# Altium schematic symbol library CMOS.SchLib: 1073 symbols (part 1 of 4) (continued)
## IRF120 (continued)
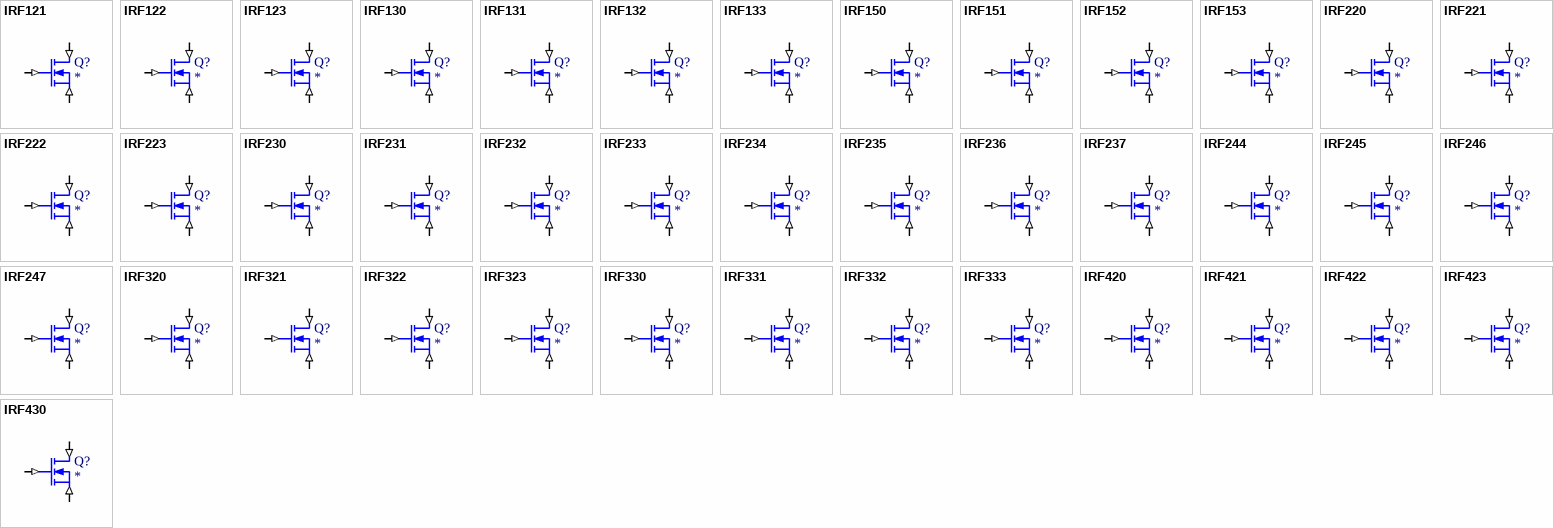
[diagram p4: symbols IRF121 to IRF430]

## IRF121
designator Q?
N-Channel MOSFET
simulation model IRF121 (SUBCKT)
pins: 1 D (in), 2 G (in), 3 S (in)
1 alternate drawing of the same symbol

## IRF122
designator Q?
N-Channel MOSFET
simulation model IRF122 (SUBCKT)
pins: 1 D (in), 2 G (in), 3 S (in)
1 alternate drawing of the same symbol

## IRF123
designator Q?
N-Channel MOSFET
simulation model IRF123 (SUBCKT)
pins: 1 D (in), 2 G (in), 3 S (in)
1 alternate drawing of the same symbol

## IRF130
designator Q?
N-Channel MOSFET
simulation model IRF130 (SUBCKT)
pins: 1 D (in), 2 G (in), 3 S (in)
1 alternate drawing of the same symbol

## IRF131
designator Q?
N-Channel MOSFET
simulation model IRF131 (SUBCKT)
pins: 1 D (in), 2 G (in), 3 S (in)
1 alternate drawing of the same symbol

## IRF132
designator Q?
N-Channel MOSFET
simulation model IRF132 (SUBCKT)
pins: 1 D (in), 2 G (in), 3 S (in)
1 alternate drawing of the same symbol

## IRF133
designator Q?
N-Channel MOSFET
simulation model IRF133 (SUBCKT)
pins: 1 D (in), 2 G (in), 3 S (in)
1 alternate drawing of the same symbol

## IRF150
designator Q?
N-Channel MOSFET
simulation model IRF150 (SUBCKT)
pins: 1 D (in), 2 G (in), 3 S (in)
1 alternate drawing of the same symbol

## IRF151
designator Q?
N-Channel MOSFET
simulation model IRF151 (SUBCKT)
pins: 1 D (in), 2 G (in), 3 S (in)
1 alternate drawing of the same symbol

## IRF152
designator Q?
N-Channel MOSFET
simulation model IRF152 (SUBCKT)
pins: 1 D (in), 2 G (in), 3 S (in)
1 alternate drawing of the same symbol

## IRF153
designator Q?
N-Channel MOSFET
simulation model IRF153 (SUBCKT)
pins: 1 D (in), 2 G (in), 3 S (in)
1 alternate drawing of the same symbol

## IRF220
designator Q?
N-Channel MOSFET
simulation model IRF220 (SUBCKT)
pins: 1 D (in), 2 G (in), 3 S (in)
1 alternate drawing of the same symbol

## IRF221
designator Q?
N-Channel MOSFET
simulation model IRF221 (SUBCKT)
pins: 1 D (in), 2 G (in), 3 S (in)
1 alternate drawing of the same symbol

## IRF222
designator Q?
N-Channel MOSFET
simulation model IRF222 (SUBCKT)
pins: 1 D (in), 2 G (in), 3 S (in)
1 alternate drawing of the same symbol

## IRF223
designator Q?
N-Channel MOSFET
simulation model IRF223 (SUBCKT)
pins: 1 D (in), 2 G (in), 3 S (in)
1 alternate drawing of the same symbol

## IRF230
designator Q?
N-Channel MOSFET
simulation model IRF230 (SUBCKT)
pins: 1 D (in), 2 G (in), 3 S (in)
1 alternate drawing of the same symbol

## IRF231
designator Q?
N-Channel MOSFET
simulation model IRF231 (SUBCKT)
pins: 1 D (in), 2 G (in), 3 S (in)
1 alternate drawing of the same symbol

## IRF232
designator Q?
N-Channel MOSFET
simulation model IRF232 (SUBCKT)
pins: 1 D (in), 2 G (in), 3 S (in)
1 alternate drawing of the same symbol

## IRF233
designator Q?
N-Channel MOSFET
simulation model IRF233 (SUBCKT)
pins: 1 D (in), 2 G (in), 3 S (in)
1 alternate drawing of the same symbol

## IRF234
designator Q?
N-Channel MOSFET
simulation model IRF234 (SUBCKT)
pins: 1 D (in), 2 G (in), 3 S (in)
1 alternate drawing of the same symbol

## IRF235
designator Q?
N-Channel MOSFET
simulation model IRF235 (SUBCKT)
pins: 1 D (in), 2 G (in), 3 S (in)
1 alternate drawing of the same symbol

## IRF236
designator Q?
N-Channel MOSFET
simulation model IRF236 (SUBCKT)
pins: 1 D (in), 2 G (in), 3 S (in)
1 alternate drawing of the same symbol

## IRF237
designator Q?
N-Channel MOSFET
simulation model IRF237 (SUBCKT)
pins: 1 D (in), 2 G (in), 3 S (in)
1 alternate drawing of the same symbol

## IRF244
designator Q?
N-Channel MOSFET
simulation model IRF244 (SUBCKT)
pins: 1 D (in), 2 G (in), 3 S (in)
1 alternate drawing of the same symbol

## IRF245
designator Q?
N-Channel MOSFET
simulation model IRF245 (SUBCKT)
pins: 1 D (in), 2 G (in), 3 S (in)
1 alternate drawing of the same symbol

## IRF246
designator Q?
N-Channel MOSFET
simulation model IRF246 (SUBCKT)
pins: 1 D (in), 2 G (in), 3 S (in)
1 alternate drawing of the same symbol

## IRF247
designator Q?
N-Channel MOSFET
simulation model IRF247 (SUBCKT)
pins: 1 D (in), 2 G (in), 3 S (in)
1 alternate drawing of the same symbol

## IRF320
designator Q?
N-Channel MOSFET
simulation model IRF320 (SUBCKT)
pins: 1 D (in), 2 G (in), 3 S (in)
1 alternate drawing of the same symbol

## IRF321
designator Q?
N-Channel MOSFET
simulation model IRF321 (SUBCKT)
pins: 1 D (in), 2 G (in), 3 S (in)
1 alternate drawing of the same symbol

## IRF322
designator Q?
N-Channel MOSFET
simulation model IRF322 (SUBCKT)
pins: 1 D (in), 2 G (in), 3 S (in)
1 alternate drawing of the same symbol

## IRF323
designator Q?
N-Channel MOSFET
simulation model IRF323 (SUBCKT)
pins: 1 D (in), 2 G (in), 3 S (in)
1 alternate drawing of the same symbol

## IRF330
designator Q?
N-Channel MOSFET
simulation model IRF330 (SUBCKT)
pins: 1 D (in), 2 G (in), 3 S (in)
1 alternate drawing of the same symbol

## IRF331
designator Q?
N-Channel MOSFET
simulation model IRF331 (SUBCKT)
pins: 1 D (in), 2 G (in), 3 S (in)
1 alternate drawing of the same symbol

## IRF332
designator Q?
N-Channel MOSFET
simulation model IRF332 (SUBCKT)
pins: 1 D (in), 2 G (in), 3 S (in)
1 alternate drawing of the same symbol

## IRF333
designator Q?
N-Channel MOSFET
simulation model IRF333 (SUBCKT)
pins: 1 D (in), 2 G (in), 3 S (in)
1 alternate drawing of the same symbol

## IRF420
designator Q?
N-Channel MOSFET
simulation model IRF420 (SUBCKT)
pins: 1 D (in), 2 G (in), 3 S (in)
1 alternate drawing of the same symbol

## IRF421
designator Q?
N-Channel MOSFET
simulation model IRF421 (SUBCKT)
pins: 1 D (in), 2 G (in), 3 S (in)
1 alternate drawing of the same symbol

## IRF422
designator Q?
N-Channel MOSFET
simulation model IRF422 (SUBCKT)
pins: 1 D (in), 2 G (in), 3 S (in)
1 alternate drawing of the same symbol

## IRF423
designator Q?
N-Channel MOSFET
simulation model IRF423 (SUBCKT)
pins: 1 D (in), 2 G (in), 3 S (in)
1 alternate drawing of the same symbol

## IRF430
designator Q?
N-Channel MOSFET
simulation model IRF430 (SUBCKT)
pins: 1 D (in), 2 G (in), 3 S (in)
1 alternate drawing of the same symbol

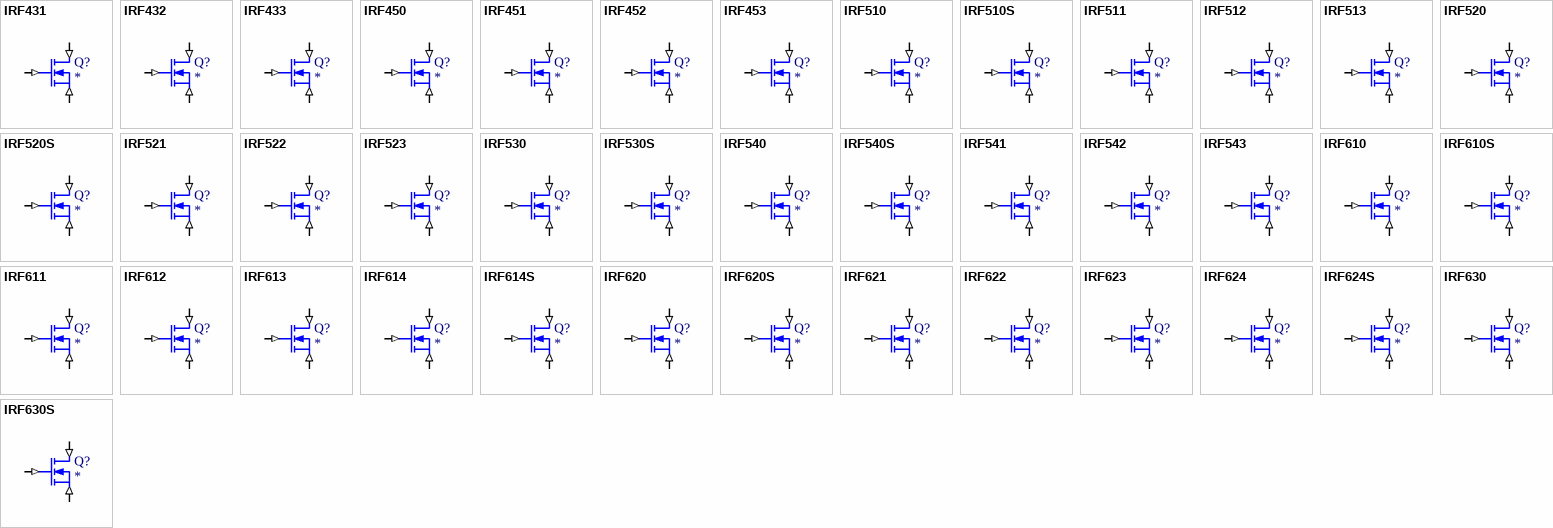
[diagram p5: symbols IRF431 to IRF630S]

## IRF431
designator Q?
N-Channel MOSFET
simulation model IRF431 (SUBCKT)
pins: 1 D (in), 2 G (in), 3 S (in)
1 alternate drawing of the same symbol

## IRF432
designator Q?
N-Channel MOSFET
simulation model IRF432 (SUBCKT)
pins: 1 D (in), 2 G (in), 3 S (in)
1 alternate drawing of the same symbol

## IRF433
designator Q?
N-Channel MOSFET
simulation model IRF433 (SUBCKT)
pins: 1 D (in), 2 G (in), 3 S (in)
1 alternate drawing of the same symbol

## IRF450
designator Q?
N-Channel MOSFET
simulation model IRF450 (SUBCKT)
pins: 1 D (in), 2 G (in), 3 S (in)
1 alternate drawing of the same symbol

## IRF451
designator Q?
N-Channel MOSFET
simulation model IRF451 (SUBCKT)
pins: 1 D (in), 2 G (in), 3 S (in)
1 alternate drawing of the same symbol

## IRF452
designator Q?
N-Channel MOSFET
simulation model IRF452 (SUBCKT)
pins: 1 D (in), 2 G (in), 3 S (in)
1 alternate drawing of the same symbol

## IRF453
designator Q?
N-Channel MOSFET
simulation model IRF453 (SUBCKT)
pins: 1 D (in), 2 G (in), 3 S (in)
1 alternate drawing of the same symbol

## IRF510
designator Q?
N-Channel MOSFET
simulation model IRF510 (SUBCKT)
pins: 1 D (in), 2 G (in), 3 S (in)
1 alternate drawing of the same symbol

## IRF510S
designator Q?
N-Channel MOSFET
simulation model IRF510S (SUBCKT)
pins: 1 D (in), 2 G (in), 3 S (in)
1 alternate drawing of the same symbol

## IRF511
designator Q?
N-Channel MOSFET
simulation model IRF511 (SUBCKT)
pins: 1 D (in), 2 G (in), 3 S (in)
1 alternate drawing of the same symbol

## IRF512
designator Q?
N-Channel MOSFET
simulation model IRF512 (SUBCKT)
pins: 1 D (in), 2 G (in), 3 S (in)
1 alternate drawing of the same symbol

## IRF513
designator Q?
N-Channel MOSFET
simulation model IRF513 (SUBCKT)
pins: 1 D (in), 2 G (in), 3 S (in)
1 alternate drawing of the same symbol

## IRF520
designator Q?
N-Channel MOSFET
simulation model IRF520 (SUBCKT)
pins: 1 D (in), 2 G (in), 3 S (in)
1 alternate drawing of the same symbol

## IRF520S
designator Q?
N-Channel MOSFET
simulation model IRF520S (SUBCKT)
pins: 1 D (in), 2 G (in), 3 S (in)
1 alternate drawing of the same symbol

## IRF521
designator Q?
N-Channel MOSFET
simulation model IRF521 (SUBCKT)
pins: 1 D (in), 2 G (in), 3 S (in)
1 alternate drawing of the same symbol

## IRF522
designator Q?
N-Channel MOSFET
simulation model IRF522 (SUBCKT)
pins: 1 D (in), 2 G (in), 3 S (in)
1 alternate drawing of the same symbol

## IRF523
designator Q?
N-Channel MOSFET
simulation model IRF523 (SUBCKT)
pins: 1 D (in), 2 G (in), 3 S (in)
1 alternate drawing of the same symbol

## IRF530
designator Q?
N-Channel MOSFET
simulation model IRF530 (SUBCKT)
pins: 1 D (in), 2 G (in), 3 S (in)
1 alternate drawing of the same symbol

## IRF530S
designator Q?
N-Channel MOSFET
simulation model IRF530S (SUBCKT)
pins: 1 D (in), 2 G (in), 3 S (in)
1 alternate drawing of the same symbol

## IRF540
designator Q?
N-Channel MOSFET
simulation model IRF540 (SUBCKT)
pins: 1 D (in), 2 G (in), 3 S (in)
1 alternate drawing of the same symbol

## IRF540S
designator Q?
N-Channel MOSFET
simulation model IRF540S (SUBCKT)
pins: 1 D (in), 2 G (in), 3 S (in)
1 alternate drawing of the same symbol

## IRF541
designator Q?
N-Channel MOSFET
simulation model IRF541 (SUBCKT)
pins: 1 D (in), 2 G (in), 3 S (in)
1 alternate drawing of the same symbol

## IRF542
designator Q?
N-Channel MOSFET
simulation model IRF542 (SUBCKT)
pins: 1 D (in), 2 G (in), 3 S (in)
1 alternate drawing of the same symbol

## IRF543
designator Q?
N-Channel MOSFET
simulation model IRF543 (SUBCKT)
pins: 1 D (in), 2 G (in), 3 S (in)
1 alternate drawing of the same symbol

## IRF610
designator Q?
N-Channel MOSFET
simulation model IRF610 (SUBCKT)
pins: 1 D (in), 2 G (in), 3 S (in)
1 alternate drawing of the same symbol

## IRF610S
designator Q?
N-Channel MOSFET
simulation model IRF610S (SUBCKT)
pins: 1 D (in), 2 G (in), 3 S (in)
1 alternate drawing of the same symbol

## IRF611
designator Q?
N-Channel MOSFET
simulation model IRF611 (SUBCKT)
pins: 1 D (in), 2 G (in), 3 S (in)
1 alternate drawing of the same symbol

## IRF612
designator Q?
N-Channel MOSFET
simulation model IRF612 (SUBCKT)
pins: 1 D (in), 2 G (in), 3 S (in)
1 alternate drawing of the same symbol

## IRF613
designator Q?
N-Channel MOSFET
simulation model IRF613 (SUBCKT)
pins: 1 D (in), 2 G (in), 3 S (in)
1 alternate drawing of the same symbol

## IRF614
designator Q?
N-Channel MOSFET
simulation model IRF614 (SUBCKT)
pins: 1 D (in), 2 G (in), 3 S (in)
1 alternate drawing of the same symbol

## IRF614S
designator Q?
N-Channel MOSFET
simulation model IRF614S (SUBCKT)
pins: 1 D (in), 2 G (in), 3 S (in)
1 alternate drawing of the same symbol

## IRF620
designator Q?
N-Channel MOSFET
simulation model IRF620 (SUBCKT)
pins: 1 D (in), 2 G (in), 3 S (in)
1 alternate drawing of the same symbol

## IRF620S
designator Q?
N-Channel MOSFET
simulation model IRF620S (SUBCKT)
pins: 1 D (in), 2 G (in), 3 S (in)
1 alternate drawing of the same symbol

## IRF621
designator Q?
N-Channel MOSFET
simulation model IRF621 (SUBCKT)
pins: 1 D (in), 2 G (in), 3 S (in)
1 alternate drawing of the same symbol

## IRF622
designator Q?
N-Channel MOSFET
simulation model IRF622 (SUBCKT)
pins: 1 D (in), 2 G (in), 3 S (in)
1 alternate drawing of the same symbol

## IRF623
designator Q?
N-Channel MOSFET
simulation model IRF623 (SUBCKT)
pins: 1 D (in), 2 G (in), 3 S (in)
1 alternate drawing of the same symbol

## IRF624
designator Q?
N-Channel MOSFET
simulation model IRF624 (SUBCKT)
pins: 1 D (in), 2 G (in), 3 S (in)
1 alternate drawing of the same symbol

## IRF624S
designator Q?
N-Channel MOSFET
simulation model IRF624S (SUBCKT)
pins: 1 D (in), 2 G (in), 3 S (in)
1 alternate drawing of the same symbol

## IRF630
designator Q?
N-Channel MOSFET
simulation model IRF630 (SUBCKT)
pins: 1 D (in), 2 G (in), 3 S (in)
1 alternate drawing of the same symbol

## IRF630S
designator Q?
N-Channel MOSFET
simulation model IRF630S (SUBCKT)
pins: 1 D (in), 2 G (in), 3 S (in)
1 alternate drawing of the same symbol

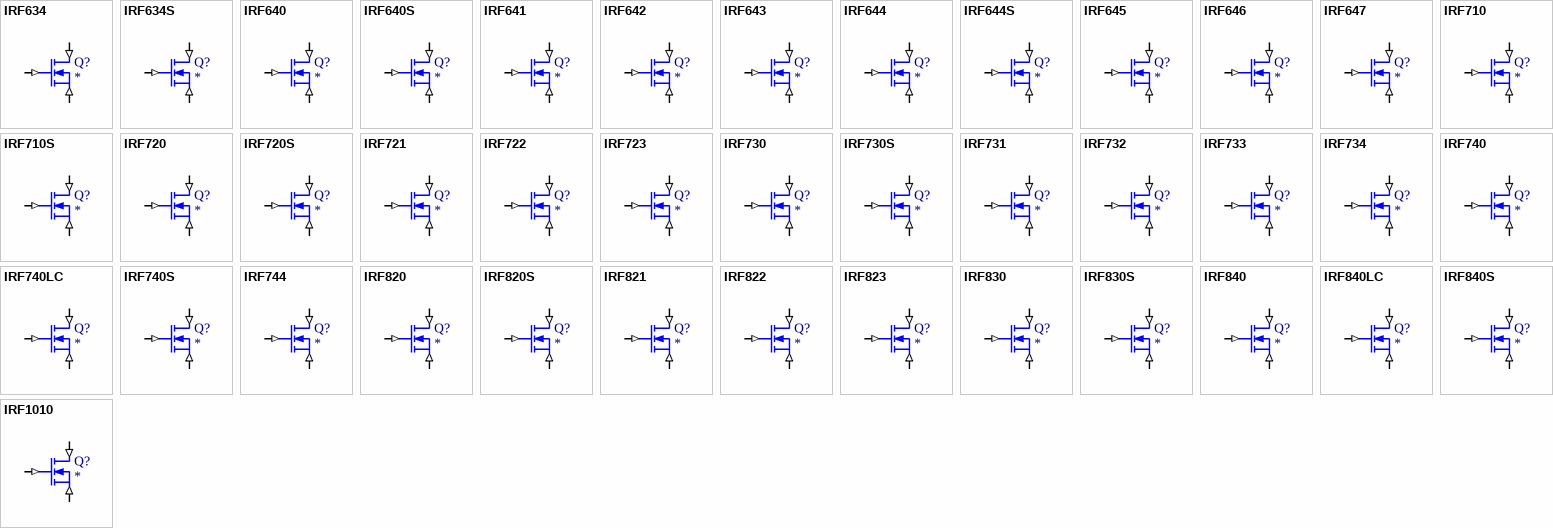
[diagram p6: symbols IRF634 to IRF1010]

## IRF634
designator Q?
N-Channel MOSFET
simulation model IRF634 (SUBCKT)
pins: 1 D (in), 2 G (in), 3 S (in)
1 alternate drawing of the same symbol

## IRF634S
designator Q?
N-Channel MOSFET
simulation model IRF634S (SUBCKT)
pins: 1 D (in), 2 G (in), 3 S (in)
1 alternate drawing of the same symbol

## IRF640
designator Q?
N-Channel MOSFET
simulation model IRF640 (SUBCKT)
pins: 1 D (in), 2 G (in), 3 S (in)
1 alternate drawing of the same symbol

## IRF640S
designator Q?
N-Channel MOSFET
simulation model IRF640S (SUBCKT)
pins: 1 D (in), 2 G (in), 3 S (in)
1 alternate drawing of the same symbol

## IRF641
designator Q?
N-Channel MOSFET
simulation model IRF641 (SUBCKT)
pins: 1 D (in), 2 G (in), 3 S (in)
1 alternate drawing of the same symbol

## IRF642
designator Q?
N-Channel MOSFET
simulation model IRF642 (SUBCKT)
pins: 1 D (in), 2 G (in), 3 S (in)
1 alternate drawing of the same symbol

## IRF643
designator Q?
N-Channel MOSFET
simulation model IRF643 (SUBCKT)
pins: 1 D (in), 2 G (in), 3 S (in)
1 alternate drawing of the same symbol

## IRF644
designator Q?
N-Channel MOSFET
simulation model IRF644 (SUBCKT)
pins: 1 D (in), 2 G (in), 3 S (in)
1 alternate drawing of the same symbol

## IRF644S
designator Q?
N-Channel MOSFET
simulation model IRF644S (SUBCKT)
pins: 1 D (in), 2 G (in), 3 S (in)
1 alternate drawing of the same symbol

## IRF645
designator Q?
N-Channel MOSFET
simulation model IRF645 (SUBCKT)
pins: 1 D (in), 2 G (in), 3 S (in)
1 alternate drawing of the same symbol

## IRF646
designator Q?
N-Channel MOSFET
simulation model IRF646 (SUBCKT)
pins: 1 D (in), 2 G (in), 3 S (in)
1 alternate drawing of the same symbol

## IRF647
designator Q?
N-Channel MOSFET
simulation model IRF647 (SUBCKT)
pins: 1 D (in), 2 G (in), 3 S (in)
1 alternate drawing of the same symbol

## IRF710
designator Q?
N-Channel MOSFET
simulation model IRF710 (SUBCKT)
pins: 1 D (in), 2 G (in), 3 S (in)
1 alternate drawing of the same symbol

## IRF710S
designator Q?
N-Channel MOSFET
simulation model IRF710S (SUBCKT)
pins: 1 D (in), 2 G (in), 3 S (in)
1 alternate drawing of the same symbol

## IRF720
designator Q?
N-Channel MOSFET
simulation model IRF720 (SUBCKT)
pins: 1 D (in), 2 G (in), 3 S (in)
1 alternate drawing of the same symbol

## IRF720S
designator Q?
N-Channel MOSFET
simulation model IRF720S (SUBCKT)
pins: 1 D (in), 2 G (in), 3 S (in)
1 alternate drawing of the same symbol

## IRF721
designator Q?
N-Channel MOSFET
simulation model IRF721 (SUBCKT)
pins: 1 D (in), 2 G (in), 3 S (in)
1 alternate drawing of the same symbol

## IRF722
designator Q?
N-Channel MOSFET
simulation model IRF722 (SUBCKT)
pins: 1 D (in), 2 G (in), 3 S (in)
1 alternate drawing of the same symbol

## IRF723
designator Q?
N-Channel MOSFET
simulation model IRF723 (SUBCKT)
pins: 1 D (in), 2 G (in), 3 S (in)
1 alternate drawing of the same symbol

## IRF730
designator Q?
N-Channel MOSFET
simulation model IRF730 (SUBCKT)
pins: 1 D (in), 2 G (in), 3 S (in)
1 alternate drawing of the same symbol

## IRF730S
designator Q?
N-Channel MOSFET
simulation model IRF730S (SUBCKT)
pins: 1 D (in), 2 G (in), 3 S (in)
1 alternate drawing of the same symbol

## IRF731
designator Q?
N-Channel MOSFET
simulation model IRF731 (SUBCKT)
pins: 1 D (in), 2 G (in), 3 S (in)
1 alternate drawing of the same symbol

## IRF732
designator Q?
N-Channel MOSFET
simulation model IRF732 (SUBCKT)
pins: 1 D (in), 2 G (in), 3 S (in)
1 alternate drawing of the same symbol

## IRF733
designator Q?
N-Channel MOSFET
simulation model IRF733 (SUBCKT)
pins: 1 D (in), 2 G (in), 3 S (in)
1 alternate drawing of the same symbol

## IRF734
designator Q?
N-Channel MOSFET
simulation model IRF734 (SUBCKT)
pins: 1 D (in), 2 G (in), 3 S (in)
1 alternate drawing of the same symbol

## IRF740
designator Q?
N-Channel MOSFET
simulation model IRF740 (SUBCKT)
pins: 1 D (in), 2 G (in), 3 S (in)
1 alternate drawing of the same symbol

## IRF740LC
designator Q?
N-Channel MOSFET
simulation model IRF740LC (SUBCKT)
pins: 1 D (in), 2 G (in), 3 S (in)
1 alternate drawing of the same symbol

## IRF740S
designator Q?
N-Channel MOSFET
simulation model IRF740S (SUBCKT)
pins: 1 D (in), 2 G (in), 3 S (in)
1 alternate drawing of the same symbol

## IRF744
designator Q?
N-Channel MOSFET
simulation model IRF744 (SUBCKT)
pins: 1 D (in), 2 G (in), 3 S (in)
1 alternate drawing of the same symbol

## IRF820
designator Q?
N-Channel MOSFET
simulation model IRF820 (SUBCKT)
pins: 1 D (in), 2 G (in), 3 S (in)
1 alternate drawing of the same symbol

## IRF820S
designator Q?
N-Channel MOSFET
simulation model IRF820S (SUBCKT)
pins: 1 D (in), 2 G (in), 3 S (in)
1 alternate drawing of the same symbol

## IRF821
designator Q?
N-Channel MOSFET
simulation model IRF821 (SUBCKT)
pins: 1 D (in), 2 G (in), 3 S (in)
1 alternate drawing of the same symbol

## IRF822
designator Q?
N-Channel MOSFET
simulation model IRF822 (SUBCKT)
pins: 1 D (in), 2 G (in), 3 S (in)
1 alternate drawing of the same symbol

## IRF823
designator Q?
N-Channel MOSFET
simulation model IRF823 (SUBCKT)
pins: 1 D (in), 2 G (in), 3 S (in)
1 alternate drawing of the same symbol

## IRF830
designator Q?
N-Channel MOSFET
simulation model IRF830 (SUBCKT)
pins: 1 D (in), 2 G (in), 3 S (in)
1 alternate drawing of the same symbol

## IRF830S
designator Q?
N-Channel MOSFET
simulation model IRF830S (SUBCKT)
pins: 1 D (in), 2 G (in), 3 S (in)
1 alternate drawing of the same symbol

## IRF840
designator Q?
N-Channel MOSFET
simulation model IRF840 (SUBCKT)
pins: 1 D (in), 2 G (in), 3 S (in)
1 alternate drawing of the same symbol

## IRF840LC
designator Q?
N-Channel MOSFET
simulation model IRF840LC (SUBCKT)
pins: 1 D (in), 2 G (in), 3 S (in)
1 alternate drawing of the same symbol

## IRF840S
designator Q?
N-Channel MOSFET
simulation model IRF840S (SUBCKT)
pins: 1 D (in), 2 G (in), 3 S (in)
1 alternate drawing of the same symbol

## IRF1010
designator Q?
N-Channel MOSFET
simulation model IRF1010 (SUBCKT)
pins: 1 D (in), 2 G (in), 3 S (in)
1 alternate drawing of the same symbol

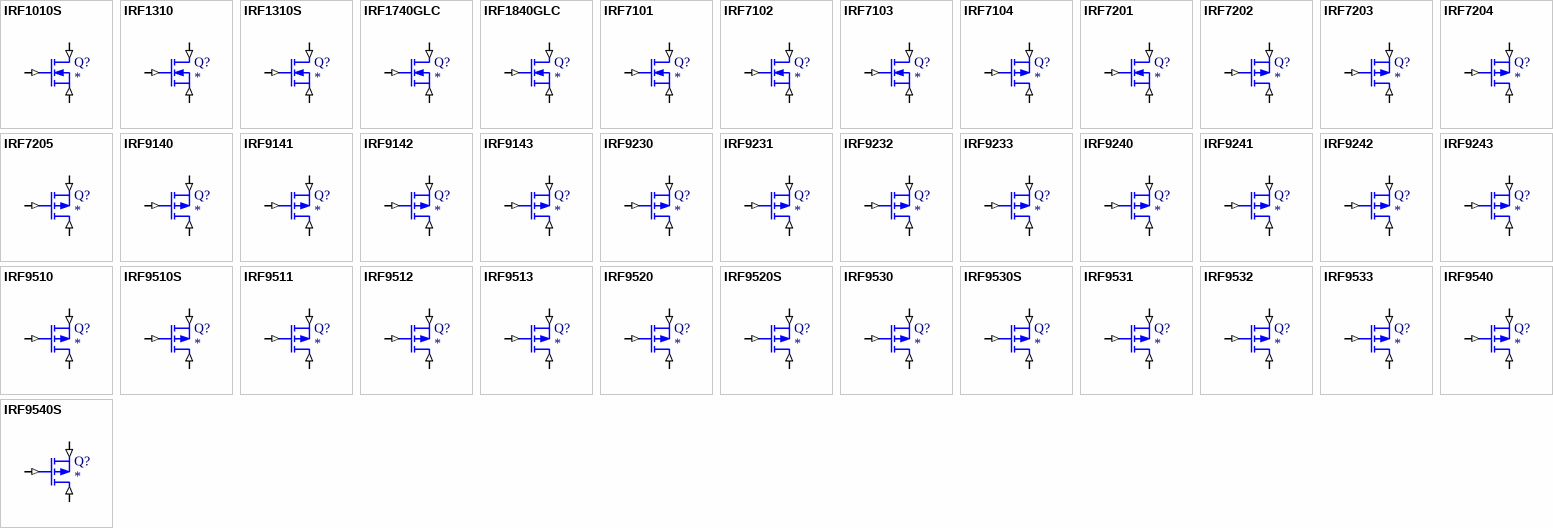
[diagram p7: symbols IRF1010S to IRF9540S]

## IRF1010S
designator Q?
N-Channel MOSFET
simulation model IRF1010S (SUBCKT)
pins: 1 D (in), 2 G (in), 3 S (in)
1 alternate drawing of the same symbol

## IRF1310
designator Q?
N-Channel MOSFET
simulation model IRF1310 (SUBCKT)
pins: 1 D (in), 2 G (in), 3 S (in)
1 alternate drawing of the same symbol

## IRF1310S
designator Q?
N-Channel MOSFET
simulation model IRF1310S (SUBCKT)
pins: 1 D (in), 2 G (in), 3 S (in)
1 alternate drawing of the same symbol

## IRF1740GLC
designator Q?
N-Channel MOSFET
simulation model IRF1740GLC (SUBCKT)
pins: 1 D (in), 2 G (in), 3 S (in)
1 alternate drawing of the same symbol

## IRF1840GLC
designator Q?
N-Channel MOSFET
simulation model IRF1840GLC (SUBCKT)
pins: 1 D (in), 2 G (in), 3 S (in)
1 alternate drawing of the same symbol

## IRF7101
designator Q?
N-Channel MOSFET
simulation model IRF7101 (SUBCKT)
pins: 1 D (in), 2 G (in), 3 S (in)
1 alternate drawing of the same symbol

## IRF7102
designator Q?
N-Channel MOSFET
simulation model IRF7102 (SUBCKT)
pins: 1 D (in), 2 G (in), 3 S (in)
1 alternate drawing of the same symbol

## IRF7103
designator Q?
N-Channel MOSFET
simulation model IRF7103 (SUBCKT)
pins: 1 D (in), 2 G (in), 3 S (in)
1 alternate drawing of the same symbol

## IRF7104
designator Q?
P-Channel MOSFET
simulation model IRF7104 (SUBCKT)
pins: 1 D (in), 2 G (in), 3 S (in)
1 alternate drawing of the same symbol

## IRF7201
designator Q?
N-Channel MOSFET
simulation model IRF7201 (SUBCKT)
pins: 1 D (in), 2 G (in), 3 S (in)
1 alternate drawing of the same symbol

## IRF7202
designator Q?
P-Channel MOSFET
simulation model IRF7202 (SUBCKT)
pins: 1 D (in), 2 G (in), 3 S (in)
1 alternate drawing of the same symbol

## IRF7203
designator Q?
P-Channel MOSFET
simulation model IRF7203 (SUBCKT)
pins: 1 D (in), 2 G (in), 3 S (in)
1 alternate drawing of the same symbol

## IRF7204
designator Q?
P-Channel MOSFET
simulation model IRF7204 (SUBCKT)
pins: 1 D (in), 2 G (in), 3 S (in)
1 alternate drawing of the same symbol

## IRF7205
designator Q?
P-Channel MOSFET
simulation model IRF7205 (SUBCKT)
pins: 1 D (in), 2 G (in), 3 S (in)
1 alternate drawing of the same symbol

## IRF9140
designator Q?
P-Channel MOSFET
simulation model IRF9140 (SUBCKT)
pins: 1 D (in), 2 G (in), 3 S (in)
1 alternate drawing of the same symbol

## IRF9141
designator Q?
P-Channel MOSFET
simulation model IRF9141 (SUBCKT)
pins: 1 D (in), 2 G (in), 3 S (in)
1 alternate drawing of the same symbol

## IRF9142
designator Q?
P-Channel MOSFET
simulation model IRF9142 (SUBCKT)
pins: 1 D (in), 2 G (in), 3 S (in)
1 alternate drawing of the same symbol

## IRF9143
designator Q?
P-Channel MOSFET
simulation model IRF9143 (SUBCKT)
pins: 1 D (in), 2 G (in), 3 S (in)
1 alternate drawing of the same symbol

## IRF9230
designator Q?
P-Channel MOSFET
simulation model IRF9230 (SUBCKT)
pins: 1 D (in), 2 G (in), 3 S (in)
1 alternate drawing of the same symbol

## IRF9231
designator Q?
P-Channel MOSFET
simulation model IRF9231 (SUBCKT)
pins: 1 D (in), 2 G (in), 3 S (in)
1 alternate drawing of the same symbol

## IRF9232
designator Q?
P-Channel MOSFET
simulation model IRF9232 (SUBCKT)
pins: 1 D (in), 2 G (in), 3 S (in)
1 alternate drawing of the same symbol

## IRF9233
designator Q?
P-Channel MOSFET
simulation model IRF9233 (SUBCKT)
pins: 1 D (in), 2 G (in), 3 S (in)
1 alternate drawing of the same symbol

## IRF9240
designator Q?
P-Channel MOSFET
simulation model IRF9240 (SUBCKT)
pins: 1 D (in), 2 G (in), 3 S (in)
1 alternate drawing of the same symbol

## IRF9241
designator Q?
P-Channel MOSFET
simulation model IRF9241 (SUBCKT)
pins: 1 D (in), 2 G (in), 3 S (in)
1 alternate drawing of the same symbol

## IRF9242
designator Q?
P-Channel MOSFET
simulation model IRF9242 (SUBCKT)
pins: 1 D (in), 2 G (in), 3 S (in)
1 alternate drawing of the same symbol

## IRF9243
designator Q?
P-Channel MOSFET
simulation model IRF9243 (SUBCKT)
pins: 1 D (in), 2 G (in), 3 S (in)
1 alternate drawing of the same symbol

## IRF9510
designator Q?
P-Channel MOSFET
simulation model IRF9510 (SUBCKT)
pins: 1 D (in), 2 G (in), 3 S (in)
1 alternate drawing of the same symbol

## IRF9510S
designator Q?
P-Channel MOSFET
simulation model IRF9510S (SUBCKT)
pins: 1 D (in), 2 G (in), 3 S (in)
1 alternate drawing of the same symbol

## IRF9511
designator Q?
P-Channel MOSFET
simulation model IRF9511 (SUBCKT)
pins: 1 D (in), 2 G (in), 3 S (in)
1 alternate drawing of the same symbol

## IRF9512
designator Q?
P-Channel MOSFET
simulation model IRF9512 (SUBCKT)
pins: 1 D (in), 2 G (in), 3 S (in)
1 alternate drawing of the same symbol

## IRF9513
designator Q?
P-Channel MOSFET
simulation model IRF9513 (SUBCKT)
pins: 1 D (in), 2 G (in), 3 S (in)
1 alternate drawing of the same symbol

## IRF9520
designator Q?
P-Channel MOSFET
simulation model IRF9520 (SUBCKT)
pins: 1 D (in), 2 G (in), 3 S (in)
1 alternate drawing of the same symbol

## IRF9520S
designator Q?
P-Channel MOSFET
simulation model IRF9520S (SUBCKT)
pins: 1 D (in), 2 G (in), 3 S (in)
1 alternate drawing of the same symbol

## IRF9530
designator Q?
P-Channel MOSFET
simulation model IRF9530 (SUBCKT)
pins: 1 D (in), 2 G (in), 3 S (in)
1 alternate drawing of the same symbol

## IRF9530S
designator Q?
P-Channel MOSFET
simulation model IRF9530S (SUBCKT)
pins: 1 D (in), 2 G (in), 3 S (in)
1 alternate drawing of the same symbol

## IRF9531
designator Q?
P-Channel MOSFET
simulation model IRF9531 (SUBCKT)
pins: 1 D (in), 2 G (in), 3 S (in)
1 alternate drawing of the same symbol

## IRF9532
designator Q?
P-Channel MOSFET
simulation model IRF9532 (SUBCKT)
pins: 1 D (in), 2 G (in), 3 S (in)
1 alternate drawing of the same symbol

## IRF9533
designator Q?
P-Channel MOSFET
simulation model IRF9533 (SUBCKT)
pins: 1 D (in), 2 G (in), 3 S (in)
1 alternate drawing of the same symbol

## IRF9540
designator Q?
P-Channel MOSFET
simulation model IRF9540 (SUBCKT)
pins: 1 D (in), 2 G (in), 3 S (in)
1 alternate drawing of the same symbol

## IRF9540S
designator Q?
P-Channel MOSFET
simulation model IRF9540S (SUBCKT)
pins: 1 D (in), 2 G (in), 3 S (in)
1 alternate drawing of the same symbol

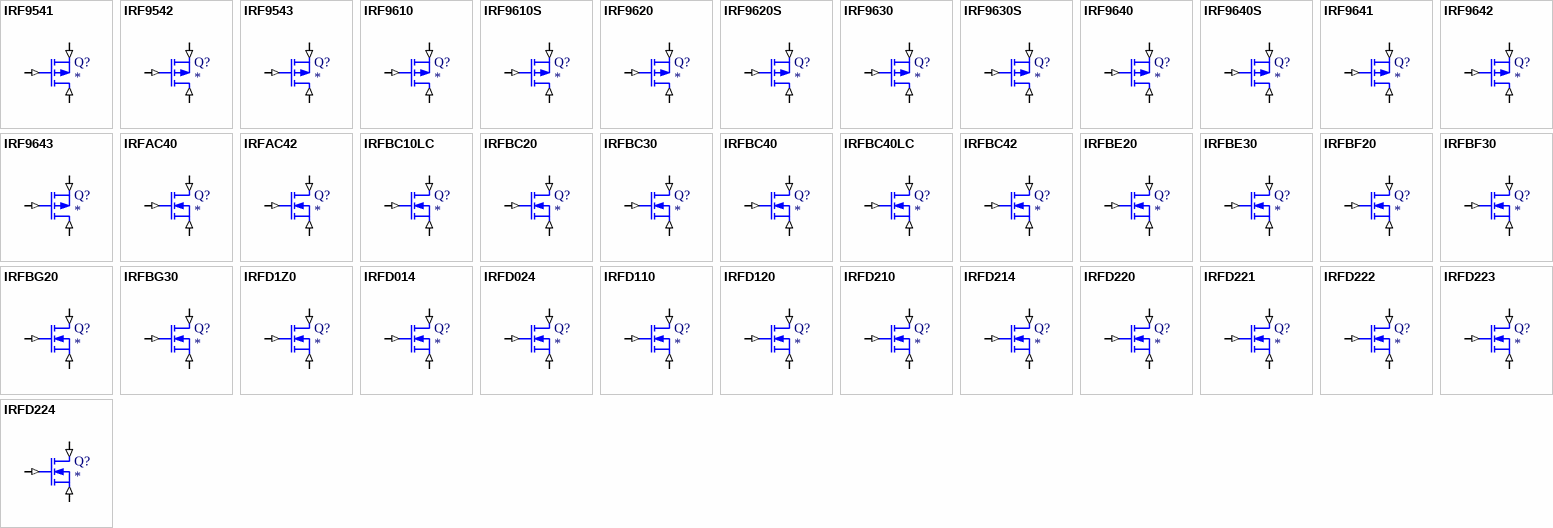
[diagram p8: symbols IRF9541 to IRFD224]

## IRF9541
designator Q?
P-Channel MOSFET
simulation model IRF9541 (SUBCKT)
pins: 1 D (in), 2 G (in), 3 S (in)
1 alternate drawing of the same symbol

## IRF9542
designator Q?
P-Channel MOSFET
simulation model IRF9542 (SUBCKT)
pins: 1 D (in), 2 G (in), 3 S (in)
1 alternate drawing of the same symbol

## IRF9543
designator Q?
P-Channel MOSFET
simulation model IRF9543 (SUBCKT)
pins: 1 D (in), 2 G (in), 3 S (in)
1 alternate drawing of the same symbol

## IRF9610
designator Q?
P-Channel MOSFET
simulation model IRF9610 (SUBCKT)
pins: 1 D (in), 2 G (in), 3 S (in)
1 alternate drawing of the same symbol

## IRF9610S
designator Q?
P-Channel MOSFET
simulation model IRF9610S (SUBCKT)
pins: 1 D (in), 2 G (in), 3 S (in)
1 alternate drawing of the same symbol

## IRF9620
designator Q?
P-Channel MOSFET
simulation model IRF9620 (SUBCKT)
pins: 1 D (in), 2 G (in), 3 S (in)
1 alternate drawing of the same symbol

## IRF9620S
designator Q?
P-Channel MOSFET
simulation model IRF9620S (SUBCKT)
pins: 1 D (in), 2 G (in), 3 S (in)
1 alternate drawing of the same symbol

## IRF9630
designator Q?
P-Channel MOSFET
simulation model IRF9630 (SUBCKT)
pins: 1 D (in), 2 G (in), 3 S (in)
1 alternate drawing of the same symbol

## IRF9630S
designator Q?
P-Channel MOSFET
simulation model IRF9630S (SUBCKT)
pins: 1 D (in), 2 G (in), 3 S (in)
1 alternate drawing of the same symbol

## IRF9640
designator Q?
P-Channel MOSFET
simulation model IRF9640 (SUBCKT)
pins: 1 D (in), 2 G (in), 3 S (in)
1 alternate drawing of the same symbol

## IRF9640S
designator Q?
P-Channel MOSFET
simulation model IRF9640S (SUBCKT)
pins: 1 D (in), 2 G (in), 3 S (in)
1 alternate drawing of the same symbol